# Altium footprint library Active.PcbLib: 308 footprints (part 17 of 22)
Each footprint in its own frame and in the unit in brackets; x right, y up, seen from the top. Pads: shape width x height; smd on the part's side, far side on the other; paste and mask are expansions set on the pad; w line width, h text height; cw(c..) or ccw(c..) is an arc to the next point about the centre after c.
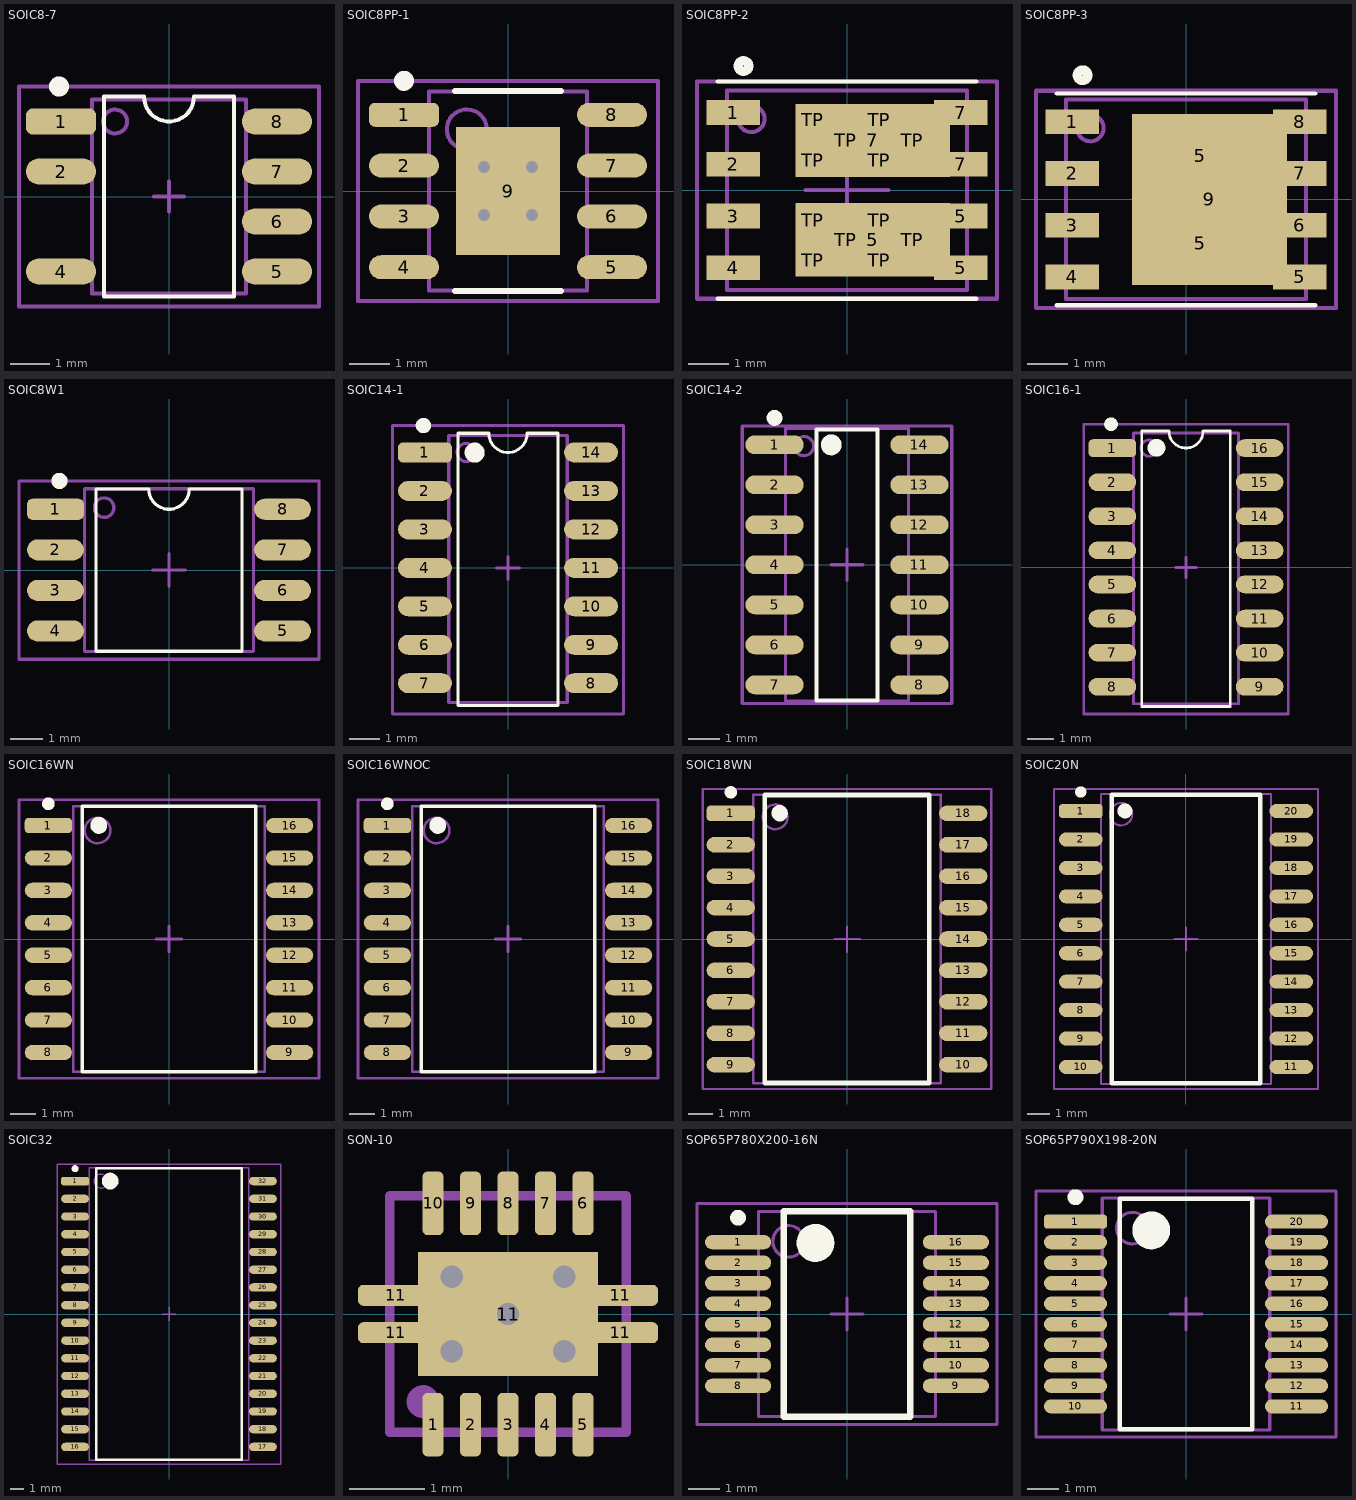
[diagram p16: the footprints below, top view; thin cyan lines are the x and y axes]

## SOIC8-7 [mil] "SOIC8 7pin R1.27mm"
height 61.02
pads (7):
  rrect50% 70x26 smd: 1(-108,75)
  oval 70x26 smd: 2(-108,25) 4(-108,-75) 5(108,-75) 6(108,-25) 7(108,25) 8(108,75)
Top Overlay:
  circle w10: c-110,110 r5
  lines w4: -65,-100 65,-100 ; -65,-100 -65,100 ; -65,-100 -65,100 ; -65,100 -25,100 ccw(c0,100) 25,100 65,100 ; 65,-100 65,100 ; 65,-100 65,100
Mechanical 13:
  circle w4: c-54,75 r12
  lines w4: -77,-97 -77,97 77,97 77,-97 -77,-97
Mechanical 15:
  lines w4: -15,0 15,0 ; 0,-15 0,15 ; -150,-110 150,-110 150,110 -150,110 -150,-110
3D body: height 62.99, standoff 0, extent -77,-97 77,97
3D body: height 63.39, standoff 62.99, extent -66.24,62.76 -41.76,87.24

## SOIC8PP-1 [mm]
pads (9):
  rrect50% 1.75x0.6 smd: 1(-2.6,1.905)
  oval 1.75x0.6 smd: 2(-2.6,0.635) 3(-2.6,-0.635) 4(-2.6,-1.905) 5(2.6,-1.905) 6(2.6,-0.635) 7(2.6,0.635) 8(2.6,1.905)
  rect 2.6x3.2 smd paste-5 mask-5: 9(0,0)
via 0.6,-0.6 diameter 0.65 hole 0.3
via -0.6,-0.6 diameter 0.65 hole 0.3
via 0.6,0.6 diameter 0.65 hole 0.3
via -0.6,0.6 diameter 0.65 hole 0.3
Top Overlay:
  circle w0.25: c-2.6,2.755 r0.125
  lines w0.15: -1.325,-2.5 1.325,-2.5 ; -1.325,2.5 1.325,2.5
Top Paste:
  region: 1.2,-1.5 0.7,-1.5 0.7,-0.975 0.95,-0.725 1.2,-0.725
  region: -0.5,-1.5 -0.5,-0.975 -0.225,-0.7 0.225,-0.7 0.5,-0.975 0.5,-1.5
  region: -1.2,-1.5 -0.7,-1.5 -0.7,-0.975 -0.975,-0.7 -1.2,-0.7
  region: -1.2,1.5 -0.7,1.5 -0.7,0.975 -0.975,0.7 -1.2,0.7
  region: -0.5,1.5 -0.5,0.975 -0.225,0.7 0.225,0.7 0.5,0.975 0.5,1.5
  region: 1.2,1.5 0.7,1.5 0.7,0.975 0.95,0.725 1.2,0.725
  region: -0.225,0.5 -0.5,0.225 -0.5,-0.225 -0.225,-0.5 0.225,-0.5 0.5,-0.225 0.5,0.225 0.225,0.5
  region: -1.2,-0.5 -0.975,-0.5 -0.7,-0.225 -0.7,0.225 -0.975,0.5 -1.2,0.5
  region: 1.2,-0.5 0.975,-0.5 0.7,-0.225 0.7,0.225 0.975,0.5 1.2,0.5
Top Solder:
  region: -1.3,1.6 -0.6,1.6 -0.6,0.931 -0.727,0.906 -0.834,0.834 -0.906,0.727 -0.931,0.6 -0.906,0.473 -0.834,0.366 -0.727,0.294 -0.6,0.269 -0.6,0.275 -0.6,-0.275 -0.6,-0.269 -0.727,-0.294 -0.834,-0.366 -0.906,-0.473 -0.931,-0.6 -0.906,-0.727 -0.834,-0.834 -0.727,-0.906 -0.6,-0.931 -0.473,-0.906 -0.366,-0.834 -0.294,-0.727 -0.269,-0.6 -0.275,-0.6 -0.269,-0.6 -0.294,-0.473 -0.366,-0.366 -0.473,-0.294 -0.6,-0.269 -0.6,-0.275 -0.6,0.269 -0.473,0.294 -0.366,0.366 -0.294,0.473 -0.269,0.6 -0.275,0.6 -0.269,0.6 -0.294,0.727 -0.366,0.834 -0.473,0.906 -0.6,0.931 -0.6,0.925 -0.6,1.6 0.6,1.6 0.6,0.931 0.473,0.906 0.366,0.834 0.294,0.727 0.269,0.6 0.275,0.6 0.269,0.6 0.294,0.473 0.366,0.366 0.473,0.294 0.6,0.269 0.6,0.275 0.6,-0.269 0.473,-0.294 0.366,-0.366 0.294,-0.473 0.269,-0.6 0.275,-0.6 0.269,-0.6 0.294,-0.727 0.366,-0.834 0.473,-0.906 0.6,-0.931 0.727,-0.906 0.834,-0.834 0.906,-0.727 0.931,-0.6 0.906,-0.473 0.834,-0.366 0.727,-0.294 0.6,-0.269 0.6,-0.275 0.6,0.275 0.6,0.269 0.727,0.294 0.834,0.366 0.906,0.473 0.931,0.6 0.906,0.727 0.834,0.834 0.727,0.906 0.6,0.931 0.6,0.925 0.6,1.6 1.3,1.6 1.3,-1.6 -1.3,-1.6
Mechanical 12:
  circle w0.4: c0.6,0.6 r0.15
  circle w0.4: c-0.6,0.6 r0.15
  circle w0.4: c-0.6,-0.6 r0.15
  circle w0.4: c0.6,-0.6 r0.15
Mechanical 13:
  circle w0.1: c-1.03,1.54 r0.5
  lines w0.1: -1.98,-2.49 1.98,-2.49 1.98,2.49 -1.98,2.49 -1.98,-2.49
Mechanical 15:
  lines w0.1: -0.5,0 0.5,0 ; 0,-0.5 0,0.5 ; -3.75,-2.75 3.75,-2.75 3.75,2.75 -3.75,2.75 -3.75,-2.75
3D body: height 1.68, standoff 0.02, extent -1.98,-2.49 1.98,2.49
3D body: height 1.69, standoff 1.68, extent -1.533,1.032 -0.52,2.042

## SOIC8PP-2 [mil] "Power Pak SO8"
pads (22):
  rect 52x24 smd: 1(-110,75) 2(-110,25) 3(-110,-25) 4(-110,-75) 5(110,-75) 5(110,-25) 7(110,25) 7(110,75)
  rect 149.61x70.87 smd paste-78.74: 5(25,-47.99) 7(25,48)
  round 30 on Top Paste: TP(-33,-68) TP(-33,-29) TP(-33,29) TP(-33,68) TP(-1,-48) TP(-1,48) TP(31,-68) TP(31,-29) TP(31,29) TP(31,68) TP(63,-48) TP(63,48)
Top Overlay:
  circle w9.06: c-100,120 r5
  lines w4.02: -125,-105 125,-105 ; -125,105 125,105
Mechanical 13:
  circle w3.94: c-92.52,68.9 r12.8
  lines w4.02: -116.14,-96.46 -116.14,96.46 116.14,96.46 116.14,-96.46 -116.14,-96.46
Mechanical 15:
  lines w4.02: -40,0 40,0 ; 0,-40 0,40 ; -145,-105 -145,105 145,105 145,-105 -145,-105
3D body: height 27.56, standoff 0, extent 116.14,65.35 120.08,85.04
3D body: height 27.56, standoff 0, extent 116.14,15.35 120.08,35.04
3D body: height 27.56, standoff 0, extent 116.14,-34.65 120.08,-14.96
3D body: height 27.56, standoff 0, extent 116.14,-84.65 120.08,-64.96
3D body: height 27.56, standoff 0, extent -120.08,-85.04 -116.14,-65.35
3D body: height 27.56, standoff 0, extent -120.08,-35.04 -116.14,-15.35
3D body: height 27.56, standoff 0, extent -120.08,14.96 -116.14,34.65
3D body: height 27.56, standoff 0, extent -120.08,64.96 -116.14,84.65
3D body: height 43.7, standoff 43.31, extent -104.24,57.11 -80.71,80.69
3D body: height 43.31, standoff 0, extent -116.14,-96.46 116.14,96.46

## SOIC8PP-3 [mil] "Power Pak SO8"
pads (11):
  rect 52x24 smd: 1(-110,75) 2(-110,25) 3(-110,-25) 4(-110,-75) 5(110,-75) 6(110,-25) 7(110,25) 8(110,75)
  rect 102.36x59.06 on Top Paste: 5(13.78,-42.32) 5(13.78,42.32)
  rect 149.61x165.35 smd paste-78.74 mask+0: 9(22.64,0)
Top Overlay:
  circle w9.06: c-100,120 r5
  lines w4.02: -125,-102.36 125,-102.36 ; -125,102.36 125,102.36
Mechanical 13:
  circle w3.94: c-92.52,68.9 r12.8
  lines w4.02: -116.14,-96.46 -116.14,96.46 116.14,96.46 116.14,-96.46 -116.14,-96.46
Mechanical 15:
  lines w4.02: -40,0 40,0 ; 0,-40 0,40 ; -145,-105 -145,105 145,105 145,-105 -145,-105
3D body: height 43.31, standoff 0, extent -116.14,-96.46 116.14,96.46
3D body: height 43.7, standoff 39.37, extent -105.57,55.85 -79.47,81.94

## SOIC8W1 [mil] "SOIC 8 pin 5.3mm wide"
height 78.74
pads (8):
  rrect50% 70x26 smd: 1(-140,75)
  oval 70x26 smd: 2(-140,25) 3(-140,-25) 4(-140,-75) 5(140,-75) 6(140,-25) 7(140,25) 8(140,75)
Top Overlay:
  circle w10: c-135,110 r5
  lines w4: -90,-100 90,-100 90,100 25,100 cw(c0,100) -25,100 -90,100 -90,-100
Mechanical 13:
  circle w4: c-80,77 r12
  lines w4: -104.33,-100.39 -104.33,100.39 104.33,100.39 104.33,-100.39 -104.33,-100.39
Mechanical 15:
  lines w4: -20,0 20,0 ; 0,-20 0,20 ; -185,-110 185,-110 185,110 -185,110 -185,-110
3D body: height 74.8, standoff 0, extent -104.33,-100.39 104.33,100.39
3D body: height 75.2, standoff 74.8, extent -91.77,65.71 -68.69,88.79

## SOIC14-1 [mil] "Small IC 14 pin"
height 59.06
pads (14):
  rrect50% 70x26 smd: 1(-108,150)
  oval 70x26 smd: 2(-108,100) 3(-108,50) 4(-108,0) 5(-108,-50) 6(-108,-100) 7(-108,-150) 8(108,-150) 9(108,-100) 10(108,-50) 11(108,0) 12(108,50) 13(108,100) 14(108,150)
Top Overlay:
  circle w14: c-43.31,149.8 r6
  circle w10: c-110,185 r5
  lines w4: -65,-179 -65,175 ; -65,-179 -65,175 ; -65,-179 65,-179 ; -65,175 -25,175 ccw(c0,175) 25,175 65,175 ; 65,-179 65,175 ; 65,-179 65,175
Mechanical 13:
  circle w4: c-54,150 r12
  lines w4: -77,-175 77,-175 77,172 -77,172 -77,-175
Mechanical 15:
  lines w4: -15,0 15,0 ; 0,-15 0,15 ; -150,-190 -150,185 150,185 150,-190 -150,-190
3D body: height 74.8, standoff 0, extent -77,-175 77,172
3D body: height 75.2, standoff 74.8, extent -67.18,136.56 -41.09,162.65

## SOIC14-2 [mm] "SOIC, 14-Leads, Body 8,6x3,9mm (max), Pitch 1,27mm, IPC High Density"
height 1.75
pads (14):
  oval 1.85x0.6 smd: 1(-2.3,3.81) 2(-2.3,2.54) 3(-2.3,1.27) 4(-2.3,0) 5(-2.3,-1.27) 6(-2.3,-2.54) 7(-2.3,-3.81) 8(2.3,-3.81) 9(2.3,-2.54) 10(2.3,-1.27) 11(2.3,0) 12(2.3,1.27) 13(2.3,2.54) 14(2.3,3.81)
Top Overlay:
  circle w0.356: c-0.5,3.805 r0.152
  circle w0.25: c-2.3,4.66 r0.125
  lines w0.127: -0.975,-4.3 0.975,-4.3 0.975,4.3 -0.975,4.3 -0.975,-4.3
Mechanical 13:
  circle w0.102: c-1.366,3.766 r0.305
  lines w0.1: -1.95,-4.325 1.95,-4.325 1.95,4.325 -1.95,4.325 -1.95,-4.325
Mechanical 15:
  lines w0.1: -0.5,0 0.5,0 ; 0,-0.5 0,0.5 ; -3.325,-4.4 3.325,-4.4 3.325,4.4 -3.325,4.4 -3.325,-4.4
3D body: height 1.91, standoff 1.9, extent -1.701,3.425 -1.038,4.088
3D body: height 1.75, standoff 0.1, extent -1.95,-4.325 1.95,4.325

## SOIC16-1 [mil] "Small IC 16 pin"
height 59.05
pads (16):
  rrect50% 70x26 smd: 1(-108,175)
  oval 70x26 smd: 2(-108,125) 3(-108,75) 4(-108,25) 5(-108,-25) 6(-108,-75) 7(-108,-125) 8(-108,-175) 9(108,-175) 10(108,-125) 11(108,-75) 12(108,-25) 13(108,25) 14(108,75) 15(108,125) 16(108,175)
Top Overlay:
  circle w14: c-43.31,175.39 r6
  circle w10: c-110,210 r5
  lines w4: -65,-204 65,-204 ; -65,-204 -65,200 ; -65,-204 -65,200 ; -65,200 -25,200 ccw(c0,200) 25,200 65,200 ; 65,-204 65,200 ; 65,-204 65,200
Mechanical 13:
  circle w4: c-54,175 r12
  lines w4: -77,-200 -77,197 77,197 77,-200 -77,-200
Mechanical 15:
  lines w4: -15,0 15,0 ; 0,-15 0,15 ; -150,-215 150,-215 150,210 -150,210 -150,-215
3D body: height 74.8, standoff 0, extent -77,-200 77,197
3D body: height 75.2, standoff 74.8, extent -67.18,162.15 -41.09,188.24

## SOIC16WN [mm] "SOIC, 16-Leads, Body 10,4x7,5mm (max), Pitch 1,27mm, IPC Medium Density"
height 2.64
pads (16):
  rrect50% 1.85x0.6 smd: 1(-4.725,4.445)
  oval 1.85x0.6 smd: 2(-4.725,3.175) 3(-4.725,1.905) 4(-4.725,0.635) 5(-4.725,-0.635) 6(-4.725,-1.905) 7(-4.725,-3.175) 8(-4.725,-4.445) 9(4.725,-4.445) 10(4.725,-3.175) 11(4.725,-1.905) 12(4.725,-0.635) 13(4.725,0.635) 14(4.725,1.905) 15(4.725,3.175) 16(4.725,4.445)
Top Overlay:
  circle w0.25: c-4.725,5.295 r0.125
  circle w0.356: c-2.75,4.45 r0.152
  lines w0.15: -3.4,-5.2 -3.4,5.2 3.4,5.2 3.4,-5.2 -3.4,-5.2
Mechanical 13:
  circle w0.1: c-2.8,4.25 r0.5
  lines w0.1: -3.75,-5.2 -3.75,5.2 3.75,5.2 3.75,-5.2 -3.75,-5.2
Mechanical 15:
  lines w0.1: -0.5,0 0.5,0 ; 0,-0.5 0,0.5 ; -5.875,-5.45 -5.875,5.45 5.875,5.45 5.875,-5.45 -5.875,-5.45
3D body: height 2.64, standoff 0.1, extent -3.75,-5.2 3.75,5.2
3D body: height 2.65, standoff 2.64, extent -3.31,3.74 -2.29,4.76

## SOIC16WNOC [mm] "SOIC, 16-Leads OptoC, 10,4x7,5x3.5mm, R1,27mm"
height 3.5
pads (16):
  rrect50% 1.85x0.6 smd: 1(-4.725,4.445)
  oval 1.85x0.6 smd: 2(-4.725,3.175) 3(-4.725,1.905) 4(-4.725,0.635) 5(-4.725,-0.635) 6(-4.725,-1.905) 7(-4.725,-3.175) 8(-4.725,-4.445) 9(4.725,-4.445) 10(4.725,-3.175) 11(4.725,-1.905) 12(4.725,-0.635) 13(4.725,0.635) 14(4.725,1.905) 15(4.725,3.175) 16(4.725,4.445)
Top Overlay:
  circle w0.356: c-2.75,4.45 r0.152
  circle w0.25: c-4.725,5.295 r0.125
  lines w0.15: -3.4,-5.2 3.4,-5.2 3.4,5.2 -3.4,5.2 -3.4,-5.2
Mechanical 13:
  circle w0.1: c-2.8,4.25 r0.5
  lines w0.1: -3.75,-5.2 3.75,-5.2 3.75,5.2 -3.75,5.2 -3.75,-5.2
Mechanical 15:
  lines w0.1: -0.5,0 0.5,0 ; 0,-0.5 0,0.5 ; -5.875,-5.45 5.875,-5.45 5.875,5.45 -5.875,5.45 -5.875,-5.45
3D body: height 3.62, standoff 2.64, extent -3.31,3.74 -2.29,4.76
3D body: height 3.6, standoff 0.1, extent -3.75,-5.2 3.75,5.2

## SOIC18WN [mm] "SOIC18W, Body 11,7x7,6mm, R1,27mm, IPC Medium Density"
height 2.54
pads (18):
  rrect50% 1.95x0.63 smd: 1(-4.7,5.08)
  oval 1.95x0.63 smd: 2(-4.7,3.81) 3(-4.7,2.54) 4(-4.7,1.27) 5(-4.7,0) 6(-4.7,-1.27) 7(-4.7,-2.54) 8(-4.7,-3.81) 9(-4.7,-5.08) 10(4.7,-5.08) 11(4.7,-3.81) 12(4.7,-2.54) 13(4.7,-1.27) 14(4.7,0) 15(4.7,1.27) 16(4.7,2.54) 17(4.7,3.81) 18(4.7,5.08)
Top Overlay:
  circle w0.356: c-2.725,5.085 r0.152
  circle w0.25: c-4.7,5.93 r0.125
  lines w0.2: -3.325,-5.815 -3.325,5.815 3.325,5.815 3.325,-5.815 -3.325,-5.815
Mechanical 13:
  circle w0.1: c-2.9,4.94 r0.5
  lines w0.1: -3.8,-5.842 -3.8,5.84 3.8,5.84 3.8,-5.842 -3.8,-5.842
Mechanical 15:
  lines w0.1: -0.492,0 0.508,0 ; 0,-0.508 0,0.492 ; -5.842,-6.065 -5.842,6.065 5.842,6.065 5.842,-6.065 -5.842,-6.065
3D body: height 2.55, standoff 0.1, extent -3.81,-5.842 3.81,5.84

## SOIC20N [mm] "SOIC20, Body 12,9x7,6mm, R1,27mm, IPC Medium Density"
height 2.55
pads (20):
  rrect50% 1.95x0.63 smd: 1(-4.7,5.715)
  oval 1.95x0.63 smd: 2(-4.7,4.445) 3(-4.7,3.175) 4(-4.7,1.905) 5(-4.7,0.635) 6(-4.7,-0.635) 7(-4.7,-1.905) 8(-4.7,-3.175) 9(-4.7,-4.445) 10(-4.7,-5.715) 11(4.7,-5.715) 12(4.7,-4.445) 13(4.7,-3.175) 14(4.7,-1.905) 15(4.7,-0.635) 16(4.7,0.635) 17(4.7,1.905) 18(4.7,3.175) 19(4.7,4.445) 20(4.7,5.715)
Top Overlay:
  circle w0.25: c-4.7,6.565 r0.125
  circle w0.356: c-2.725,5.72 r0.152
  lines w0.2: -3.325,-6.45 -3.325,6.45 3.325,6.45 3.325,-6.45 -3.325,-6.45
Mechanical 13:
  circle w0.1: c-2.9,5.575 r0.5
  lines w0.1: -3.8,-6.475 -3.8,6.475 3.8,6.475 3.8,-6.475 -3.8,-6.475
Mechanical 15:
  lines w0.1: -0.5,0 0.5,0 ; 0,-0.5 0,0.5 ; -5.9,-6.7 -5.9,6.7 5.9,6.7 5.9,-6.7 -5.9,-6.7
3D body: height 2.55, standoff 0.1, extent -3.8,-6.475 3.8,6.475
3D body: height 2.6, standoff 2.55, extent -3.41,5.065 -2.39,6.085

## SOIC32 [mm] "SOIC, 32-Leads, Body 20.8x8.9mm, Pitch 1.27mm, IPC Medium Density"
height 2.64
pads (32):
  rrect50% 2x0.6 smd: 1(-6.731,9.525)
  oval 2x0.6 smd: 2(-6.731,8.255) 3(-6.731,6.985) 4(-6.731,5.715) 5(-6.731,4.445) 6(-6.731,3.175) 7(-6.731,1.905) 8(-6.731,0.635) 9(-6.731,-0.635) 10(-6.731,-1.905) 11(-6.731,-3.175) 12(-6.731,-4.445) 13(-6.731,-5.715) 14(-6.731,-6.985) 15(-6.731,-8.255) 16(-6.731,-9.525) 17(6.731,-9.525) 18(6.731,-8.255) 19(6.731,-6.985) 20(6.731,-5.715) 21(6.731,-4.445) 22(6.731,-3.175) 23(6.731,-1.905) 24(6.731,-0.635) 25(6.731,0.635) 26(6.731,1.905) 27(6.731,3.175) 28(6.731,4.445) 29(6.731,5.715) 30(6.731,6.985) 31(6.731,8.255) 32(6.731,9.525)
Top Overlay:
  circle w0.25: c-6.729,10.414 r0.125
  circle w0.6: c-4.212,9.525 r0.3
  lines w0.2: -5.207,-10.45 -5.207,10.45 5.207,10.45 5.207,-10.45 -5.207,-10.45
Mechanical 13:
  circle w0.1: c-4.869,9.525 r0.5
  lines w0.1: -5.715,-10.465 -5.715,10.465 5.715,10.465 5.715,-10.465 -5.715,-10.465
Mechanical 15:
  lines w0.1: -0.5,0 0.5,0 ; 0,-0.5 0,0.5 ; -8.001,-10.75 -8.001,10.75 8.001,10.75 8.001,-10.75 -8.001,-10.75
3D body: height 2.64, standoff 0, extent -5.715,-10.465 5.715,10.465

## SON-10 [mm] "TPS52100 package 3x3x1 mm"
height 1
pads (15):
  rrect50% 0.28x0.85 smd mask+0.07: 1(-1,-1.475) 2(-0.5,-1.475) 3(0,-1.475) 4(0.5,-1.475) 5(1,-1.475) 6(1,1.475) 7(0.5,1.475) 8(0,1.475) 9(-0.5,1.475) 10(-1,1.475)
  rrect50% 1x0.28 smd paste-7 mask+0.07: 11(-1.5,-0.25) 11(-1.5,0.25) 11(1.5,-0.25) 11(1.5,0.25)
  rect 2.4x1.65 smd paste-7 mask+0.07: 11(0,0)
via 0,0 diameter 0.55 hole 0.3
via 0.75,0.5 diameter 0.55 hole 0.3
via -0.75,0.5 diameter 0.55 hole 0.3
via -0.75,-0.5 diameter 0.55 hole 0.3
via 0.75,-0.5 diameter 0.55 hole 0.3
Top Paste:
  region: -1.38,0.38 -1.88,0.38 -1.88,0.12 -1.38,0.12
  rectangle: 1.38,0.12 1.88,0.38
  rectangle: 1.38,-0.38 1.88,-0.12
  region: -1.38,-0.12 -1.88,-0.12 -1.88,-0.38 -1.38,-0.38
  region: 1.16,-0.11 0.11,-0.11 0.11,-0.79 1.16,-0.79
  rectangle: -1.16,-0.79 -0.11,-0.11
  region: 1.16,0.79 0.11,0.79 0.11,0.11 1.16,0.11
  rectangle: -1.16,0.11 -0.11,0.79
Top Solder:
  circle w0.102: c0.75,-0.5 r0.305
  circle w0.102: c-0.75,-0.5 r0.305
  circle w0.102: c0,0 r0.305
  circle w0.102: c-0.75,0.5 r0.305
  circle w0.102: c0.75,0.5 r0.305
  region: 1.27,-0.889 1.27,0 0.305,0 0.305,-0.152 0.152,-0.305 0,-0.305 0,-0.889 0.457,-0.432 0.457,-0.356 0.61,-0.203 0.864,-0.203 1.055,-0.394 1.055,-0.647 0.889,-0.813 0.635,-0.813 0.457,-0.635 0.457,-0.432 0,-0.889
  region: -1.27,-0.889 -1.27,0 -0.305,0 -0.305,-0.152 -0.152,-0.305 0,-0.305 0,-0.889 -0.457,-0.432 -0.457,-0.356 -0.61,-0.203 -0.864,-0.203 -1.055,-0.394 -1.055,-0.647 -0.889,-0.813 -0.635,-0.813 -0.457,-0.635 -0.457,-0.432 0,-0.889
  region: -1.27,0.889 -1.27,0 -0.305,0 -0.305,0.152 -0.152,0.305 0,0.305 0,0.889 -0.457,0.432 -0.457,0.356 -0.61,0.203 -0.864,0.203 -1.055,0.394 -1.055,0.647 -0.889,0.813 -0.635,0.813 -0.457,0.635 -0.457,0.432 0,0.889
  region: 1.27,0.889 1.27,0 0.305,0 0.305,0.152 0.152,0.305 0,0.305 0,0.889 0.457,0.432 0.457,0.356 0.61,0.203 0.864,0.203 1.055,0.394 1.055,0.647 0.889,0.813 0.635,0.813 0.457,0.635 0.457,0.432 0,0.889
Mechanical 13:
  circle w0.254: c-1.133,-1.168 r0.092
  lines w0.127: -1.575,-1.575 1.575,-1.575 1.575,1.575 -1.575,1.575 -1.575,-1.575
3D body: height 1, standoff 0, extent -1.575,-1.575 1.575,1.575
3D body: height 1.01, standoff 1, extent -1.342,-1.372 -0.944,-0.972

## SOP65P780X200-16N [mm] "SOP, 16-Leads, Body 6,5x5,6mm (max), Pitch 0,65mm, IPC Medium Density"
height 2
pads (16):
  oval 2.1x0.45 smd mask+0.051: 1(-3.45,2.275) 2(-3.45,1.625) 3(-3.45,0.975) 4(-3.45,0.325) 5(-3.45,-0.325) 6(-3.45,-0.975) 7(-3.45,-1.625) 8(-3.45,-2.275) 9(3.45,-2.275) 10(3.45,-1.625) 11(3.45,-0.975) 12(3.45,-0.325) 13(3.45,0.325) 14(3.45,0.975) 15(3.45,1.625) 16(3.45,2.275)
Top Overlay:
  circle w0.6: c-1,2.25 r0.3
  circle w0.25: c-3.45,3.05 r0.125
  lines w0.2: -2,-3.25 2,-3.25 2,3.25 -2,3.25 -2,-3.25
Mechanical 13:
  circle w0.1: c-1.85,2.3 r0.5
  lines w0.1: -2.8,-3.25 2.8,-3.25 2.8,3.25 -2.8,3.25 -2.8,-3.25
Mechanical 15:
  lines w0.1: -0.5,0 0.5,0 ; 0,-0.5 0,0.5 ; -4.75,-3.5 4.75,-3.5 4.75,3.5 -4.75,3.5 -4.75,-3.5
3D body: height 2, standoff 0.05, extent -2.8,-3.25 2.8,3.25

## SOP65P790X198-20N [mm] "SOP, 20-Leads, Body 7,3x5,3mm (max), Pitch 0,65mm, IPC Medium Density"
height 1.98
pads (20):
  rrect50% 2x0.45 smd mask+0.051: 1(-3.5,2.925)
  oval 2x0.45 smd mask+0.051: 2(-3.5,2.275) 3(-3.5,1.625) 4(-3.5,0.975) 5(-3.5,0.325) 6(-3.5,-0.325) 7(-3.5,-0.975) 8(-3.5,-1.625) 9(-3.5,-2.275) 10(-3.5,-2.925) 11(3.5,-2.925) 12(3.5,-2.275) 13(3.5,-1.625) 14(3.5,-0.975) 15(3.5,-0.325) 16(3.5,0.325) 17(3.5,0.975) 18(3.5,1.625) 19(3.5,2.275) 20(3.5,2.925)
Top Overlay:
  circle w0.6: c-1.1,2.65 r0.3
  circle w0.25: c-3.5,3.7 r0.125
  lines w0.15: -2.1,-3.65 2.1,-3.65 2.1,3.65 -2.1,3.65 -2.1,-3.65
Mechanical 13:
  circle w0.1: c-1.7,2.72 r0.5
  lines w0.1: -2.65,-3.67 2.65,-3.67 2.65,3.67 -2.65,3.67 -2.65,-3.67
Mechanical 15:
  lines w0.1: -0.5,0 0.5,0 ; 0,-0.5 0,0.5 ; -4.75,-3.9 4.75,-3.9 4.75,3.9 -4.75,3.9 -4.75,-3.9
3D body: height 1.98, standoff 0.15, extent -2.65,-3.67 2.65,3.67